# Altium footprint library ACTION_IC.PcbLib: 137 footprints (part 1 of 9)
Each footprint in its own frame and in the unit in brackets; x right, y up, seen from the top. Pads: shape width x height; smd on the part's side, far side on the other; paste and mask are expansions set on the pad; w line width, h text height; cw(c..) or ccw(c..) is an arc to the next point about the centre after c.
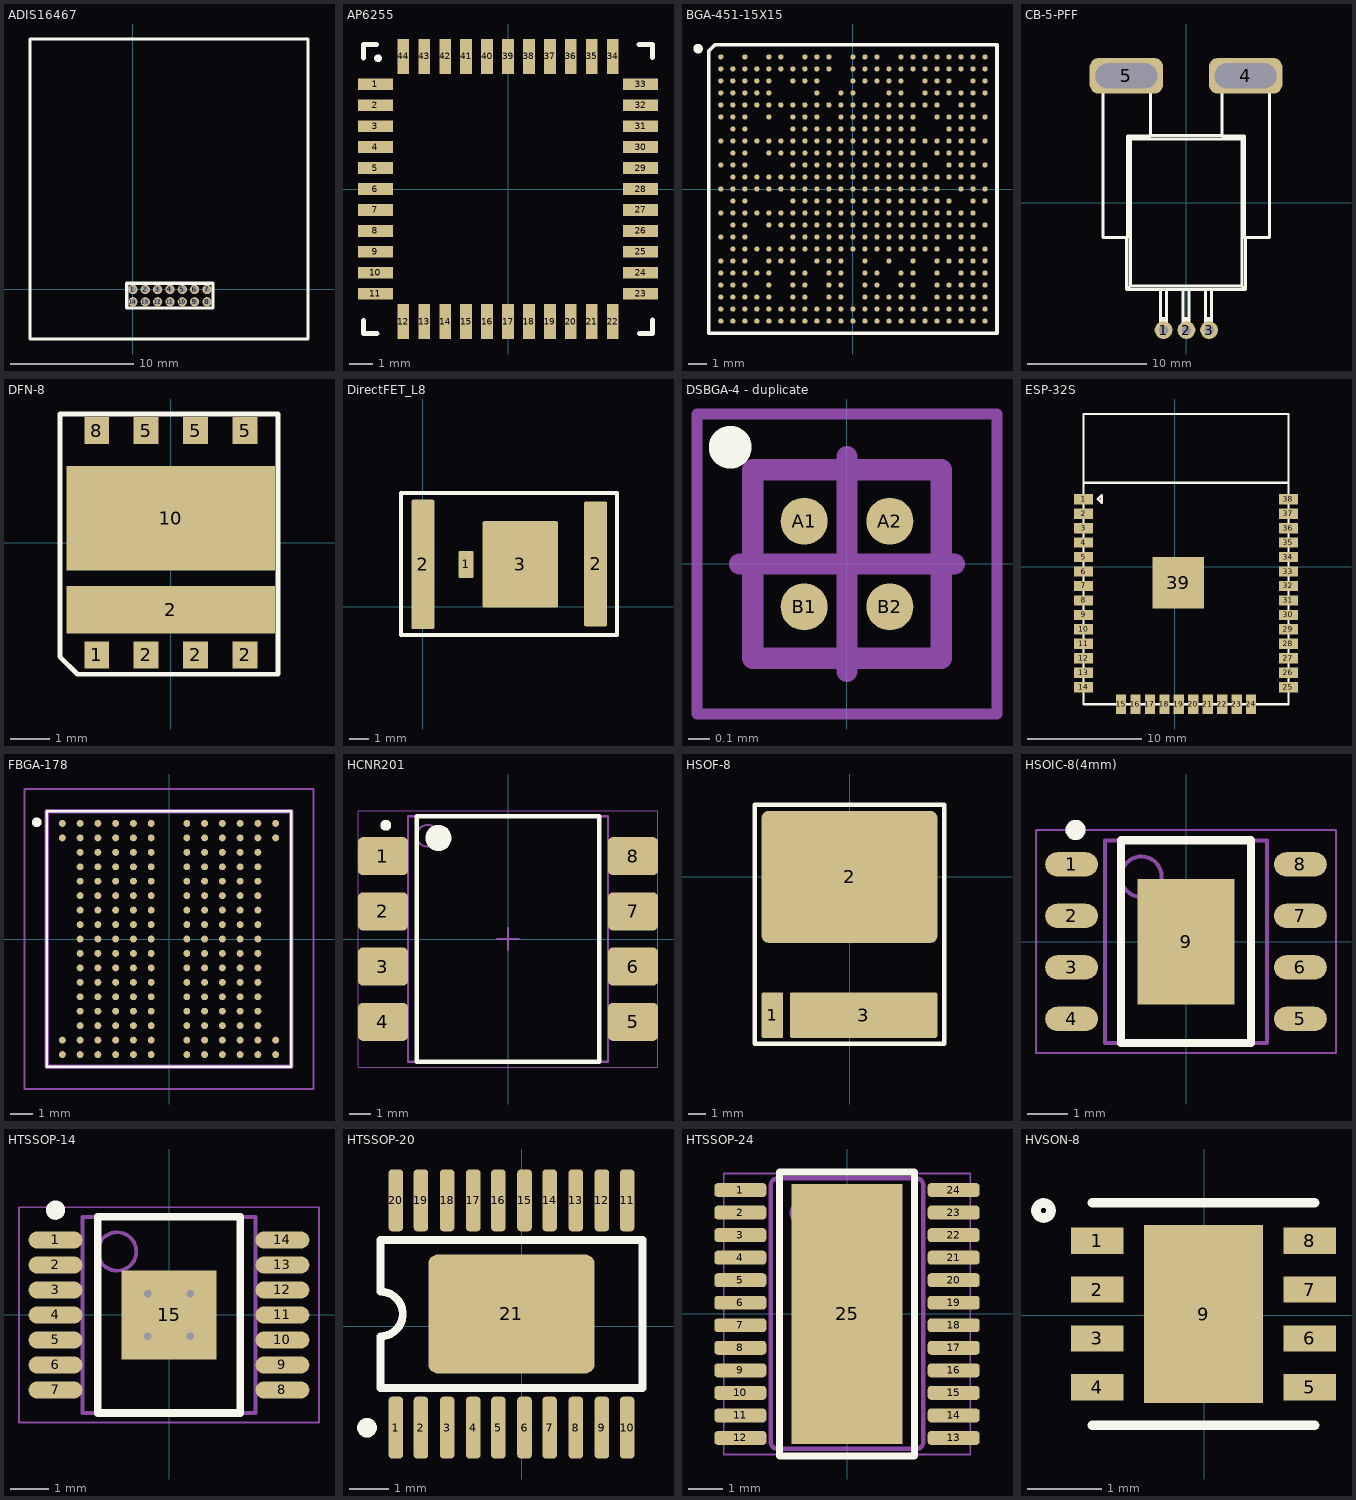
[diagram p0: the footprints below, top view; thin cyan lines are the x and y axes]

## ADIS16467 [mm]
pads (14):
  round 0.75 hole 0.5: 1(0,0) 2(1,0) 3(2,0) 4(3,0) 5(4,0) 6(5,0) 7(6,0) 8(6,-1) 9(5,-1) 10(4,-1) 11(3,-1) 12(2,-1) 13(1,-1) 14(0,-1)
Top Overlay:
  lines w0.254: -8.331,-4.013 14.173,-4.013 14.173,20.295 -8.331,20.295 -8.331,-4.013 ; -0.5,-1.5 6.5,-1.5 6.5,0.5 -0.5,0.5 -0.5,-1.5
3D body "ADIS16467-3BMLZ.STEP": height 9.11, standoff 0.11, extent -8.325,-4.013 14.167,20.287

## AP6255 [mm]
pads (44):
  rect 1.5x0.5 smd: 1(-5.688,4.5) 2(-5.688,3.6) 3(-5.688,2.7) 4(-5.688,1.8) 5(-5.688,0.9) 6(-5.688,0) 7(-5.688,-0.9) 8(-5.688,-1.8) 9(-5.688,-2.7) 10(-5.688,-3.6) 11(-5.688,-4.5) 23(5.688,-4.5) 24(5.688,-3.6) 25(5.688,-2.7) 26(5.688,-1.8) 27(5.688,-0.9) 28(5.688,0) 29(5.688,0.9) 30(5.688,1.8) 31(5.688,2.7) 32(5.688,3.6) 33(5.688,4.5)
  rect 0.5x1.5 smd: 12(-4.5,-5.688) 13(-3.6,-5.688) 14(-2.7,-5.688) 15(-1.8,-5.688) 16(-0.9,-5.688) 17(0,-5.688) 18(0.9,-5.688) 19(1.8,-5.688) 20(2.7,-5.688) 21(3.6,-5.688) 22(4.5,-5.688) 34(4.5,5.688) 35(3.6,5.688) 36(2.7,5.688) 37(1.8,5.688) 38(0.9,5.688) 39(0,5.688) 40(-0.9,5.688) 41(-1.8,5.688) 42(-2.7,5.688) 43(-3.6,5.688) 44(-4.5,5.688)
Top Overlay:
  circle w0.3: c-5.576,5.611 r0.018
  lines w0.2: -6.2,-6.2 -6.2,-5.632 ; -6.2,5.611 -6.2,5.756 -6.2,6.044 -6.2,6.189 ; -6.2,6.2 -5.632,6.2 ; -6.189,-6.2 -6.044,-6.2 -5.756,-6.2 -5.611,-6.2 ; 5.611,6.2 5.756,6.2 6.044,6.2 6.189,6.2 ; 5.632,-6.2 6.2,-6.2 ; 6.2,-6.189 6.2,-6.044 6.2,-5.756 6.2,-5.611 ; 6.2,5.632 6.2,6.2
3D body "User Library-AP62XX-1.step": height 1.52, standoff 0, extent -6,-6 6,6

## BGA-451-15X15 [mm]
pads (451):
  round 0.285 smd: A1(-7.15,7.15) A3(-5.85,7.15) A5(-4.55,7.15) A6(-3.9,7.15) A8(-2.6,7.15) A9(-1.95,7.15) A10(-1.3,7.15) A12(0,7.15) A13(0.65,7.15) A14(1.3,7.15) A16(2.6,7.15) A17(3.25,7.15) A18(3.9,7.15) A19(4.55,7.15) A20(5.2,7.15) A21(5.85,7.15) A22(6.5,7.15) A23(7.15,7.15) AA1(-7.15,-5.85) AA2(-6.5,-5.85) AA3(-5.85,-5.85) AA4(-5.2,-5.85) AA5(-4.55,-5.85) AA7(-3.25,-5.85) AA8(-2.6,-5.85) AA10(-1.3,-5.85) AA11(-0.65,-5.85) AA13(0.65,-5.85) AA14(1.3,-5.85) AA15(1.95,-5.85) AA16(2.6,-5.85) AA17(3.25,-5.85) AA19(4.55,-5.85) AA20(5.2,-5.85) AA21(5.85,-5.85) AA22(6.5,-5.85) AA23(7.15,-5.85) AB1(-7.15,-6.5) AB2(-6.5,-6.5) AB3(-5.85,-6.5) AB4(-5.2,-6.5) AB5(-4.55,-6.5) AB6(-3.9,-6.5) AB7(-3.25,-6.5) AB8(-2.6,-6.5) AB9(-1.95,-6.5) AB10(-1.3,-6.5) AB11(-0.65,-6.5) AB12(0,-6.5) AB13(0.65,-6.5) AB14(1.3,-6.5) AB15(1.95,-6.5) AB16(2.6,-6.5) AB17(3.25,-6.5) AB18(3.9,-6.5) AB19(4.55,-6.5) AB20(5.2,-6.5) AB21(5.85,-6.5) AB22(6.5,-6.5) AB23(7.15,-6.5) AC1(-7.15,-7.15) AC2(-6.5,-7.15) AC3(-5.85,-7.15) AC4(-5.2,-7.15) AC5(-4.55,-7.15) AC6(-3.9,-7.15) AC7(-3.25,-7.15) AC8(-2.6,-7.15) AC9(-1.95,-7.15) AC10(-1.3,-7.15) AC11(-0.65,-7.15) AC12(0,-7.15) AC13(0.65,-7.15) AC14(1.3,-7.15) AC15(1.95,-7.15) AC16(2.6,-7.15) AC17(3.25,-7.15) AC18(3.9,-7.15) AC19(4.55,-7.15) AC20(5.2,-7.15) AC21(5.85,-7.15) AC22(6.5,-7.15) AC23(7.15,-7.15) B1(-7.15,6.5) B2(-6.5,6.5) B3(-5.85,6.5) B4(-5.2,6.5) B5(-4.55,6.5) B6(-3.9,6.5) B7(-3.25,6.5) B8(-2.6,6.5) B9(-1.95,6.5) B10(-1.3,6.5) B12(0,6.5) B13(0.65,6.5) B14(1.3,6.5) B15(1.95,6.5) B16(2.6,6.5) B17(3.25,6.5) B18(3.9,6.5) B19(4.55,6.5) B20(5.2,6.5) B21(5.85,6.5) B22(6.5,6.5) B23(7.15,6.5) C1(-7.15,5.85) C2(-6.5,5.85) C3(-5.85,5.85) C4(-5.2,5.85) C5(-4.55,5.85) C7(-3.25,5.85) C8(-2.6,5.85) C9(-1.95,5.85) C12(0,5.85) C13(0.65,5.85) C14(1.3,5.85) C15(1.95,5.85) C16(2.6,5.85) C18(3.9,5.85) C19(4.55,5.85) C20(5.2,5.85) C22(6.5,5.85) C23(7.15,5.85) D1(-7.15,5.2) D2(-6.5,5.2) D3(-5.85,5.2) D4(-5.2,5.2) D5(-4.55,5.2) D9(-1.95,5.2) D11(-0.65,5.2) D12(0,5.2) D15(1.95,5.2) D16(2.6,5.2) D18(3.9,5.2) D19(4.55,5.2) D20(5.2,5.2) D21(5.85,5.2) D22(6.5,5.2) D23(7.15,5.2) E1(-7.15,4.55) E2(-6.5,4.55) E3(-5.85,4.55) E4(-5.2,4.55) E5(-4.55,4.55) E6(-3.9,4.55) E7(-3.25,4.55) E8(-2.6,4.55) E9(-1.95,4.55) E10(-1.3,4.55) E11(-0.65,4.55) E12(0,4.55) E13(0.65,4.55) E14(1.3,4.55) E15(1.95,4.55) E16(2.6,4.55) E17(3.25,4.55) E18(3.9,4.55) E19(4.55,4.55) E21(5.85,4.55) E22(6.5,4.55) F1(-7.15,3.9) F2(-6.5,3.9) F3(-5.85,3.9) F5(-4.55,3.9) F7(-3.25,3.9) F8(-2.6,3.9) F9(-1.95,3.9) F11(-0.65,3.9) F12(0,3.9) F13(0.65,3.9) F14(1.3,3.9) F15(1.95,3.9) F16(2.6,3.9) F17(3.25,3.9) F19(4.55,3.9) F20(5.2,3.9) F21(5.85,3.9) F22(6.5,3.9) F23(7.15,3.9) G2(-6.5,3.25) G3(-5.85,3.25) G7(-3.25,3.25) G8(-2.6,3.25) G9(-1.95,3.25) G10(-1.3,3.25) G11(-0.65,3.25) G12(0,3.25) G13(0.65,3.25) G14(1.3,3.25) G15(1.95,3.25) G16(2.6,3.25) G17(3.25,3.25) G20(5.2,3.25) G21(5.85,3.25) G22(6.5,3.25) H1(-7.15,2.6) H2(-6.5,2.6) H3(-5.85,2.6) H4(-5.2,2.6) H5(-4.55,2.6) H6(-3.9,2.6) H7(-3.25,2.6) H8(-2.6,2.6) H9(-1.95,2.6) H10(-1.3,2.6) H11(-0.65,2.6) H12(0,2.6) H13(0.65,2.6) H14(1.3,2.6) H15(1.95,2.6) H16(2.6,2.6) H17(3.25,2.6) H18(3.9,2.6) H19(4.55,2.6) H20(5.2,2.6) H21(5.85,2.6) H22(6.5,2.6) H23(7.15,2.6) J2(-6.5,1.95) J3(-5.85,1.95) J5(-4.55,1.95) J6(-3.9,1.95) J7(-3.25,1.95) J8(-2.6,1.95) J9(-1.95,1.95) J10(-1.3,1.95) J11(-0.65,1.95) J12(0,1.95) J13(0.65,1.95) J14(1.3,1.95) J15(1.95,1.95) J16(2.6,1.95) J17(3.25,1.95) J19(4.55,1.95) J20(5.2,1.95) J21(5.85,1.95) J22(6.5,1.95) K1(-7.15,1.3) K2(-6.5,1.3) K3(-5.85,1.3) K7(-3.25,1.3) K8(-2.6,1.3) K9(-1.95,1.3) K10(-1.3,1.3) K11(-0.65,1.3) K12(0,1.3) K13(0.65,1.3) K14(1.3,1.3) K15(1.95,1.3) K16(2.6,1.3) K17(3.25,1.3) K18(3.9,1.3) K20(5.2,1.3) K21(5.85,1.3) K22(6.5,1.3) K23(7.15,1.3) L2(-6.5,0.65) L3(-5.85,0.65) L4(-5.2,0.65) L5(-4.55,0.65) L6(-3.9,0.65) L7(-3.25,0.65) L8(-2.6,0.65) L9(-1.95,0.65) L10(-1.3,0.65) L11(-0.65,0.65) L12(0,0.65) L13(0.65,0.65) L14(1.3,0.65) L15(1.95,0.65) L16(2.6,0.65) L17(3.25,0.65) L18(3.9,0.65) L19(4.55,0.65) L20(5.2,0.65) L21(5.85,0.65) L22(6.5,0.65) M1(-7.15,0) M2(-6.5,0) M3(-5.85,0) M4(-5.2,0) M5(-4.55,0) M6(-3.9,0) M7(-3.25,0) M8(-2.6,0) M9(-1.95,0) M10(-1.3,0) M11(-0.65,0) M12(0,0) M13(0.65,0) M14(1.3,0) M15(1.95,0) M16(2.6,0) M17(3.25,0) M18(3.9,0) M19(4.55,0) M21(5.85,0) M22(6.5,0) M23(7.15,0) N2(-6.5,-0.65) N3(-5.85,-0.65) N7(-3.25,-0.65) N8(-2.6,-0.65) N9(-1.95,-0.65) N10(-1.3,-0.65) N11(-0.65,-0.65) N12(0,-0.65) N13(0.65,-0.65) N14(1.3,-0.65) N15(1.95,-0.65) N16(2.6,-0.65) N17(3.25,-0.65) N18(3.9,-0.65) N19(4.55,-0.65) N20(5.2,-0.65) N22(6.5,-0.65) N23(7.15,-0.65) P1(-7.15,-1.3) P2(-6.5,-1.3) P3(-5.85,-1.3) P4(-5.2,-1.3) P5(-4.55,-1.3) P6(-3.9,-1.3) P7(-3.25,-1.3) P8(-2.6,-1.3) P9(-1.95,-1.3) P10(-1.3,-1.3) P11(-0.65,-1.3) P12(0,-1.3) P13(0.65,-1.3) P14(1.3,-1.3) P15(1.95,-1.3) P16(2.6,-1.3) P17(3.25,-1.3) P18(3.9,-1.3) P19(4.55,-1.3) P20(5.2,-1.3) P21(5.85,-1.3) P22(6.5,-1.3) R2(-6.5,-1.95) R3(-5.85,-1.95) R5(-4.55,-1.95) R6(-3.9,-1.95) R7(-3.25,-1.95) R8(-2.6,-1.95) R9(-1.95,-1.95) R10(-1.3,-1.95) R11(-0.65,-1.95) R12(0,-1.95) R13(0.65,-1.95) R14(1.3,-1.95) R15(1.95,-1.95) R16(2.6,-1.95) R17(3.25,-1.95) R18(3.9,-1.95) R19(4.55,-1.95) R20(5.2,-1.95) R21(5.85,-1.95) R22(6.5,-1.95) R23(7.15,-1.95) T1(-7.15,-2.6) T2(-6.5,-2.6) T3(-5.85,-2.6) T7(-3.25,-2.6) T8(-2.6,-2.6) T9(-1.95,-2.6) T10(-1.3,-2.6) T11(-0.65,-2.6) T12(0,-2.6) T13(0.65,-2.6) T14(1.3,-2.6) T15(1.95,-2.6) T16(2.6,-2.6) T17(3.25,-2.6) T18(3.9,-2.6) T19(4.55,-2.6) T20(5.2,-2.6) T21(5.85,-2.6) T22(6.5,-2.6) U2(-6.5,-3.25) U3(-5.85,-3.25) U4(-5.2,-3.25) U5(-4.55,-3.25) U6(-3.9,-3.25) U7(-3.25,-3.25) U8(-2.6,-3.25) U9(-1.95,-3.25) U10(-1.3,-3.25) U11(-0.65,-3.25) U12(0,-3.25) U13(0.65,-3.25) U14(1.3,-3.25) U15(1.95,-3.25) U16(2.6,-3.25) U17(3.25,-3.25) U18(3.9,-3.25) U19(4.55,-3.25) U21(5.85,-3.25) U22(6.5,-3.25) U23(7.15,-3.25) V1(-7.15,-3.9) V2(-6.5,-3.9) V3(-5.85,-3.9) V5(-4.55,-3.9) V6(-3.9,-3.9) V7(-3.25,-3.9) V9(-1.95,-3.9) V10(-1.3,-3.9) V11(-0.65,-3.9) V13(0.65,-3.9) V15(1.95,-3.9) V17(3.25,-3.9) V19(4.55,-3.9) V20(5.2,-3.9) V21(5.85,-3.9) V22(6.5,-3.9) V23(7.15,-3.9) W1(-7.15,-4.55) W2(-6.5,-4.55) W3(-5.85,-4.55) W4(-5.2,-4.55) W5(-4.55,-4.55) W7(-3.25,-4.55) W8(-2.6,-4.55) W10(-1.3,-4.55) W11(-0.65,-4.55) W13(0.65,-4.55) W14(1.3,-4.55) W16(2.6,-4.55) W17(3.25,-4.55) W19(4.55,-4.55) W21(5.85,-4.55) W22(6.5,-4.55) W23(7.15,-4.55) Y1(-7.15,-5.2) Y2(-6.5,-5.2) Y3(-5.85,-5.2) Y5(-4.55,-5.2) Y7(-3.25,-5.2) Y8(-2.6,-5.2) Y10(-1.3,-5.2) Y11(-0.65,-5.2) Y13(0.65,-5.2) Y14(1.3,-5.2) Y16(2.6,-5.2) Y17(3.25,-5.2) Y19(4.55,-5.2) Y20(5.2,-5.2) Y21(5.85,-5.2) Y22(6.5,-5.2) Y23(7.15,-5.2)
Top Overlay:
  circle w0.4: c-8.382,7.595 r0.057
  lines w0.2: -7.8,-7.8 7.8,-7.8 7.8,7.8 -7.475,7.8 -7.8,7.475 -7.8,-7.8
3D body "User Library-LFBGA364.STEP": height 1.5, standoff 0, extent -7.5,-7.5 7.5,7.5

## CB-5-PFF [mm]
pads (5):
  round 1.5 hole 0.8: 1(-1.892,-10.706) 2(0.038,-10.706) 3(1.943,-10.706)
  rrect50% 6.2x3 hole 2.1 slot 5.2 at 0 deg: 4(5.016,10.706) 5(-5.016,10.706)
Top Overlay:
  lines w0.254: -4.989,-2.901 -4.989,-7.301 ; -2.989,5.699 3.011,5.699 ; -2.139,-10.552 -2.139,-9.982 ; -2.139,-10.431 -2.139,-9.743 ; -1.639,-10.552 -1.639,-9.982 ; -1.639,-10.431 -1.639,-9.743 ; -0.239,-10.552 -0.239,-9.982 ; -0.239,-10.431 -0.239,-9.743 ; 0.261,-10.552 0.261,-9.982 ; 0.261,-10.431 0.261,-9.743 ; 1.661,-10.552 1.661,-9.982 ; 1.661,-10.431 1.661,-9.743 ; 2.161,-10.552 2.161,-9.982 ; 2.161,-10.431 2.161,-9.743 ; 5.011,-2.901 5.011,-7.301 ; -6.989,9.475 -6.989,11.724 ; -6.989,9.475 -6.989,-2.901 -4.923,-2.901 -4.923,5.633 ; -6.989,9.475 -2.989,9.475 ; -6.989,11.724 -6.989,11.821 -2.989,11.821 -2.989,11.724 ; -6.989,11.724 -2.989,11.724 ; -4.989,-7.301 -4.682,-6.995 ; -4.989,-7.301 -2.139,-7.301 ; -4.923,5.633 -4.682,5.392 ; -4.923,5.633 -2.989,5.633 -2.989,9.475 ; -4.682,-6.995 -4.682,5.392 ; -4.682,-6.995 4.705,-6.995 ; -4.682,5.392 4.705,5.392 ; -2.989,9.475 -2.989,11.724 ; -2.139,-9.982 -1.639,-9.982 ; -2.139,-9.982 -1.639,-9.982 ; -2.139,-9.743 -2.139,-7.301 ; -2.139,-9.743 -1.639,-9.743 ; -2.139,-7.301 -1.639,-7.301 ; -1.639,-9.743 -1.639,-7.301 ; -1.639,-7.301 -0.239,-7.301 ; -0.239,-9.982 0.261,-9.982 ; -0.239,-9.982 0.261,-9.982 ; -0.239,-9.743 -0.239,-7.301 ; -0.239,-9.743 0.261,-9.743 ; -0.239,-7.301 0.261,-7.301 ; 0.261,-9.743 0.261,-7.301 ; 0.261,-7.301 1.661,-7.301 ; 1.661,-9.982 2.161,-9.982 ; 1.661,-9.982 2.161,-9.982 ; 1.661,-9.743 1.661,-7.301 ; 1.661,-9.743 2.161,-9.743 ; 1.661,-7.301 2.161,-7.301 ; 2.161,-9.743 2.161,-7.301 ; 2.161,-7.301 5.011,-7.301 ; 3.011,9.475 3.011,11.724 ; 3.011,9.475 3.011,5.633 4.946,5.633 ; 3.011,9.475 7.011,9.475 ; 3.011,11.724 3.011,11.821 7.011,11.821 7.011,11.724 ; 3.011,11.724 7.011,11.724 ; 4.705,-6.995 5.011,-7.301 ; 4.705,-6.995 4.705,5.392 ; 4.705,5.392 4.946,5.633 ; 4.946,5.633 4.946,-2.901 7.011,-2.901 7.011,9.475 ; 7.011,9.475 7.011,11.724
3D body "SW3dPS-ACS754SCB-200-PFF.STEP": height 7.31, standoff -3.2, extent -6.951,-11.24 7.049,11.582

## DFN-8 [mm]
height 1.1
pads (10):
  rect 0.64x0.69 smd mask+0.102: 1(-1.905,-2.88) 2(-0.635,-2.88) 2(0.635,-2.88) 2(1.905,-2.88) 5(-0.635,2.88) 5(0.635,2.88) 5(1.905,2.88) 8(-1.905,2.88)
  rect 5.35x1.22 smd: 2(0,-1.72)
  rect 5.35x2.68 smd: 10(0,0.63)
Top Overlay:
  lines w0.127: -2.85,-2.925 -2.4,-3.375 2.75,-3.375 2.75,3.3 -2.85,3.3 -2.85,-2.925
3D body: height 0.25, standoff 0, extent -2.547,-3.125 2.547,3.125

## DirectFET_L8 [mm]
pads (4):
  rrect15% 0.8x1.4 smd: 1(2.25,2.2)
  rrect15% 1.2x6.75 smd: 2(0,2.2)
  rrect15% 1.2x6.5 smd: 2(9,2.225)
  rrect5% 3.95x4.5 smd: 3(5.075,2.2)
Top Overlay:
  lines w0.2: -1.143,-1.473 10.109,-1.473 10.109,5.918 -0.66,5.918 -1.143,5.918 -1.143,-1.473
3D body "User Library-DirectFET-L8_AUIRF7669L2.step": height 0.83, standoff 0, extent -0.105,-1.315 9.045,5.785

## DSBGA-4 - duplicate [mm] "BGA, 4-Leads, Body 0.88x0.88mmx0.68mm, Pitch 0.40mm"
height 0.68
pads (4):
  round 0.22 smd: A1(-0.2,0.2) A2(0.2,0.2) B1(-0.2,-0.2) B2(0.2,-0.2)
Top Overlay:
  circle w0.1: c-0.545,0.545 r0.05
Mechanical 13:
  lines w0.1: -0.44,-0.44 0.44,-0.44 0.44,0.44 -0.44,0.44 -0.44,-0.44
Mechanical 15:
  lines w0.05: -0.7,-0.7 0.7,-0.7 0.7,0.7 -0.7,0.7 -0.7,-0.7
  lines w0.1: -0.5,0 0.5,0 ; 0,-0.5 0,0.5
3D body: height 0.68, standoff 0.17, extent -0.44,-0.44 0.44,0.44

## ESP-32S [mm]
pads (39):
  rect 1.7x0.9 smd: 1(-8.009,5.937) 2(-8.009,4.667) 3(-8.009,3.397) 4(-8.009,2.127) 5(-8.009,0.857) 6(-8.009,-0.413) 7(-8.009,-1.683) 8(-8.009,-2.953) 9(-8.009,-4.223) 10(-8.009,-5.493) 11(-8.009,-6.763) 12(-8.009,-8.033) 13(-8.009,-9.303) 14(-8.009,-10.573) 25(9.991,-10.573) 26(9.991,-9.303) 27(9.991,-8.033) 28(9.991,-6.763) 29(9.991,-5.493) 30(9.991,-4.223) 31(9.991,-2.953) 32(9.991,-1.683) 33(9.991,-0.413) 34(9.991,0.857) 35(9.991,2.127) 36(9.991,3.397) 37(9.991,4.667) 38(9.991,5.937)
  rect 0.9x1.7 smd: 15(-4.719,-12.083) 16(-3.449,-12.083) 17(-2.179,-12.083) 18(-0.909,-12.083) 19(0.361,-12.083) 20(1.631,-12.083) 21(2.901,-12.083) 22(4.171,-12.083) 23(5.441,-12.083) 24(6.711,-12.083)
  rect 4.5x4.5 smd: 39(0.311,-1.403)
Top Overlay:
  lines w0.2: -8.009,7.377 9.991,7.377 ; -8.009,-12.073 9.991,-12.073 9.991,13.427 -8.009,13.427 -8.009,-12.073 ; -6.759,5.957 -6.409,6.307 -6.409,5.607 -6.759,5.957

## FBGA-178 [mm]
pads (178):
  round 0.31 smd: A1(-4.8,5.2) A2(-4,5.2) A3(-3.2,5.2) A4(-2.4,5.2) A5(-1.6,5.2) A6(-0.8,5.2) A8(0.8,5.2) A9(1.6,5.2) A10(2.4,5.2) A11(3.2,5.2) A12(4,5.2) A13(4.8,5.2) B1(-4.8,4.55) B2(-4,4.55) B3(-3.2,4.55) B4(-2.4,4.55) B5(-1.6,4.55) B6(-0.8,4.55) B8(0.8,4.55) B9(1.6,4.55) B10(2.4,4.55) B11(3.2,4.55) B12(4,4.55) B13(4.8,4.55) C2(-4,3.9) C3(-3.2,3.9) C4(-2.4,3.9) C5(-1.6,3.9) C6(-0.8,3.9) C8(0.8,3.9) C9(1.6,3.9) C10(2.4,3.9) C11(3.2,3.9) C12(4,3.9) D2(-4,3.25) D3(-3.2,3.25) D4(-2.4,3.25) D5(-1.6,3.25) D6(-0.8,3.25) D8(0.8,3.25) D9(1.6,3.25) D10(2.4,3.25) D11(3.2,3.25) D12(4,3.25) E2(-4,2.6) E3(-3.2,2.6) E4(-2.4,2.6) E5(-1.6,2.6) E6(-0.8,2.6) E8(0.8,2.6) E9(1.6,2.6) E10(2.4,2.6) E11(3.2,2.6) E12(4,2.6) F2(-4,1.95) F3(-3.2,1.95) F4(-2.4,1.95) F5(-1.6,1.95) F6(-0.8,1.95) F8(0.8,1.95) F9(1.6,1.95) F10(2.4,1.95) F11(3.2,1.95) F12(4,1.95) G2(-4,1.3) G3(-3.2,1.3) G4(-2.4,1.3) G5(-1.6,1.3) G6(-0.8,1.3) G8(0.8,1.3) G9(1.6,1.3) G10(2.4,1.3) G11(3.2,1.3) G12(4,1.3) H2(-4,0.65) H3(-3.2,0.65) H4(-2.4,0.65) H5(-1.6,0.65) H6(-0.8,0.65) H8(0.8,0.65) H9(1.6,0.65) H10(2.4,0.65) H11(3.2,0.65) H12(4,0.65) J2(-4,0) J3(-3.2,0) J4(-2.4,0) J5(-1.6,0) J6(-0.8,0) J8(0.8,0) J9(1.6,0) J10(2.4,0) J11(3.2,0) J12(4,0) K2(-4,-0.65) K3(-3.2,-0.65) K4(-2.4,-0.65) K5(-1.6,-0.65) K6(-0.8,-0.65) K8(0.8,-0.65) K9(1.6,-0.65) K10(2.4,-0.65) K11(3.2,-0.65) K12(4,-0.65) L2(-4,-1.3) L3(-3.2,-1.3) L4(-2.4,-1.3) L5(-1.6,-1.3) L6(-0.8,-1.3) L8(0.8,-1.3) L9(1.6,-1.3) L10(2.4,-1.3) L11(3.2,-1.3) L12(4,-1.3) M2(-4,-1.95) M3(-3.2,-1.95) M4(-2.4,-1.95) M5(-1.6,-1.95) M6(-0.8,-1.95) M8(0.8,-1.95) M9(1.6,-1.95) M10(2.4,-1.95) M11(3.2,-1.95) M12(4,-1.95) N2(-4,-2.6) N3(-3.2,-2.6) N4(-2.4,-2.6) N5(-1.6,-2.6) N6(-0.8,-2.6) N8(0.8,-2.6) N9(1.6,-2.6) N10(2.4,-2.6) N11(3.2,-2.6) N12(4,-2.6) P2(-4,-3.25) P3(-3.2,-3.25) P4(-2.4,-3.25) P5(-1.6,-3.25) P6(-0.8,-3.25) P8(0.8,-3.25) P9(1.6,-3.25) P10(2.4,-3.25) P11(3.2,-3.25) P12(4,-3.25) R2(-4,-3.9) R3(-3.2,-3.9) R4(-2.4,-3.9) R5(-1.6,-3.9) R6(-0.8,-3.9) R8(0.8,-3.9) R9(1.6,-3.9) R10(2.4,-3.9) R11(3.2,-3.9) R12(4,-3.9) T1(-4.8,-4.55) T2(-4,-4.55) T3(-3.2,-4.55) T4(-2.4,-4.55) T5(-1.6,-4.55) T6(-0.8,-4.55) T8(0.8,-4.55) T9(1.6,-4.55) T10(2.4,-4.55) T11(3.2,-4.55) T12(4,-4.55) T13(4.8,-4.55) U1(-4.8,-5.2) U2(-4,-5.2) U3(-3.2,-5.2) U4(-2.4,-5.2) U5(-1.6,-5.2) U6(-0.8,-5.2) U8(0.8,-5.2) U9(1.6,-5.2) U10(2.4,-5.2) U11(3.2,-5.2) U12(4,-5.2) U13(4.8,-5.2)
Top Overlay:
  circle w0.254: c-5.95,5.25 r0.09
  lines w0.1: -5.5,-5.75 -5.5,5.75 5.5,5.75 5.5,-5.75 -5.5,-5.75
Mechanical 13:
  lines w0.2: -5.5,-5.75 -5.5,5.75 5.5,5.75 5.5,-5.75 -5.5,-5.75
Mechanical 15:
  lines w0.1: -6.5,-6.75 -6.5,6.75 6.5,6.75 6.5,-6.75 -6.5,-6.75
3D body "W63CH2MBVACE.stp": height 1.1, standoff 0, extent -5.5,-5.75 5.5,5.75

## HCNR201 [mm]
height 4
pads (8):
  rrect25% 2.3x1.75 smd: 1(-5.752,3.81) 2(-5.752,1.27) 3(-5.752,-1.27) 4(-5.752,-3.81) 5(5.752,-3.81) 6(5.752,-1.27) 7(5.752,1.27) 8(5.752,3.81)
Top Overlay:
  circle w0.6: c-3.2,4.65 r0.3
  circle w0.25: c-5.625,5.235 r0.125
  lines w0.2: -4.2,-5.65 4.2,-5.65 4.2,5.65 -4.2,5.65 -4.2,-5.65
Mechanical 13:
  circle w0.1: c-3.7,4.75 r0.5
  lines w0.1: -4.6,-5.65 4.6,-5.65 4.6,5.65 -4.6,5.65 -4.6,-5.65
Mechanical 15:
  lines w0.05: -6.9,-5.9 6.9,-5.9 6.9,5.9 -6.9,5.9 -6.9,-5.9
  lines w0.1: -0.5,0 0.5,0 ; 0,-0.5 0,0.5
3D body "SOP-8(9mm).step": height 4, standoff 0, extent -6.15,-5.65 6.15,5.65

## HSOF-8 [mm]
pads (3):
  rrect15% 1.225x2.6 smd: 1(-4.388,-7.868)
  rrect10% 10x7.5 smd: 2(0,0)
  rrect10% 8.4x2.6 smd: 3(0.8,-7.868)
Top Overlay:
  lines w0.254: -5.4,-9.5 5.4,-9.5 5.4,4.1 -5.4,4.1 -5.4,-9.5
3D body "User Library-PG-HSOF-8-1.STEP": height 2.35, standoff 0.05, extent -4.95,-8.578 4.95,3.097

## HSOIC-8(4mm) [mm]
height 1.7
pads (9):
  oval 1.3x0.6 smd: 1(-2.824,1.905) 2(-2.824,0.635) 3(-2.824,-0.635) 4(-2.824,-1.905) 5(2.824,-1.905) 6(2.824,-0.635) 7(2.824,0.635) 8(2.824,1.905)
  rect 2.4x3.1 smd: 9(0,0)
Top Overlay:
  circle w0.25: c-2.725,2.755 r0.125
  lines w0.2: -1.6,-2.5 -1.6,2.5 1.6,2.5 1.6,-2.5 -1.6,-2.5
Mechanical 13:
  circle w0.1: c-1.1,1.6 r0.5
  lines w0.1: -2,-2.5 -2,2.5 2,2.5 2,-2.5 -2,-2.5
Mechanical 15:
  lines w0.05: -3.7,-2.75 -3.7,2.75 3.7,2.75 3.7,-2.75 -3.7,-2.75
  lines w0.1: -0.5,0 0.5,0 ; 0,-0.5 0,0.5
3D body "User Library-sop-8.STEP": height 1.6, standoff 0, extent -3.021,-2.51 3.021,2.51

## HTSSOP-14 [mm]
height 1.2
pads (15):
  oval 1.4x0.45 smd: 1(-2.95,1.95) 2(-2.95,1.3) 3(-2.95,0.65) 4(-2.95,0) 5(-2.95,-0.65) 6(-2.95,-1.3) 7(-2.95,-1.95) 8(2.95,-1.95) 9(2.95,-1.3) 10(2.95,-0.65) 11(2.95,0) 12(2.95,0.65) 13(2.95,1.3) 14(2.95,1.95)
  rect 2.46x2.31 smd: 15(0,0)
via 0.55,-0.55 diameter 0.5 hole 0.2
via -0.55,-0.55 diameter 0.5 hole 0.2
via 0.55,0.55 diameter 0.5 hole 0.2
via -0.55,0.55 diameter 0.5 hole 0.2
Top Overlay:
  circle w0.25: c-2.95,2.725 r0.125
  lines w0.2: -1.85,-2.55 1.85,-2.55 1.85,2.55 -1.85,2.55 -1.85,-2.55
Mechanical 13:
  circle w0.1: c-1.35,1.65 r0.5
  lines w0.1: -2.25,-2.55 2.25,-2.55 2.25,2.55 -2.25,2.55 -2.25,-2.55
Mechanical 15:
  lines w0.05: -3.9,-2.8 3.9,-2.8 3.9,2.8 -3.9,2.8 -3.9,-2.8
  lines w0.1: -0.5,0 0.5,0 ; 0,-0.5 0,0.5
3D body "HTSSOP-14.step": height 1.2, standoff 0, extent -3.2,-2.55 3.2,2.55

## HTSSOP-20 [mil]
pads (21):
  rrect50% 14.5x61.5 smd: 1(-125,-100.99) 2(-100,-100.99) 3(-74,-100.99) 4(-48,-100.99) 5(-23,-100.99) 6(3,-100.99) 7(28,-100.99) 8(54,-100.99) 9(80,-100.99) 10(105,-100.99) 11(105,125.01) 12(80,125.01) 13(54,125.01) 14(28,125.01) 15(3,125.01) 16(-23,125.01) 17(-48,125.01) 18(-74,125.01) 19(-100,125.01) 20(-125,125.01)
  rrect15% 165.35x118.11 smd: 21(-10,12.01)
Top Overlay:
  lines w7.9: -140.31,-61.46 -140.31,-10.28 ccw(c-140.31,12.01) -140.32,34.31 -140.31,85.49 120.31,85.49 120.31,-61.46 -140.31,-61.46
  lines w9.8: -153.7,-96.29 ccw(c-153.65,-101.19) -153.6,-96.29
3D body "User Library-HTSSOP20.step": height 37.4, standoff -2.26, extent -137.95,-113.54 117.95,139

## HTSSOP-24 [mm]
pads (25):
  rrect50% 1.5x0.4 smd paste+0 mask+0.051: 1(-3.076,3.575) 2(-3.076,2.925) 3(-3.076,2.275) 4(-3.076,1.625) 5(-3.076,0.975) 6(-3.076,0.325) 7(-3.076,-0.325) 8(-3.076,-0.975) 9(-3.076,-1.625) 10(-3.076,-2.275) 11(-3.076,-2.925) 12(-3.076,-3.575) 13(3.076,-3.575) 14(3.076,-2.925) 15(3.076,-2.275) 16(3.076,-1.625) 17(3.076,-0.975) 18(3.076,-0.325) 19(3.076,0.325) 20(3.076,0.975) 21(3.076,1.625) 22(3.076,2.275) 23(3.076,2.925) 24(3.076,3.575)
  rect 3.2x7.5 smd paste-3.887 mask-3.886: 25(0,0)
Top Overlay:
  lines w0.2: -1.95,-4.1 1.95,-4.1 1.95,4.1 -1.95,4.1 -1.95,-4.1
Top Paste:
  region: 1.587,-2.629 1.577,-2.63 -1.527,-2.63 -1.536,-2.629 -1.545,-2.626 -1.553,-2.622 -1.561,-2.616 -1.567,-2.609 -1.571,-2.6 -1.574,-2.591 -1.575,-2.582 -1.575,2.582 -1.574,2.591 -1.571,2.6 -1.567,2.609 -1.561,2.616 -1.553,2.622 -1.545,2.626 -1.536,2.629 -1.527,2.63 1.577,2.63 1.587,2.629 1.596,2.626 1.604,2.622 1.611,2.616 1.617,2.609 1.622,2.6 1.624,2.591 1.625,2.582 1.625,-2.582 1.624,-2.591 1.622,-2.6 1.617,-2.609 1.611,-2.616 1.604,-2.622 1.596,-2.626
Top Solder:
  region: 1.587,-2.629 1.577,-2.63 -1.527,-2.63 -1.536,-2.629 -1.545,-2.626 -1.553,-2.622 -1.561,-2.616 -1.567,-2.609 -1.571,-2.6 -1.574,-2.591 -1.575,-2.582 -1.575,2.582 -1.574,2.591 -1.571,2.6 -1.567,2.609 -1.561,2.616 -1.553,2.622 -1.545,2.626 -1.536,2.629 -1.527,2.63 1.577,2.63 1.587,2.629 1.596,2.626 1.604,2.622 1.611,2.616 1.617,2.609 1.622,2.6 1.624,2.591 1.625,2.582 1.625,-2.582 1.624,-2.591 1.622,-2.6 1.617,-2.609 1.611,-2.616 1.604,-2.622 1.596,-2.626
Mechanical 13:
  lines w0.127: -2.2,-3.689 ccw(c-2,-3.689) -2,-3.889 2,-3.889 ccw(c2,-3.689) 2.2,-3.689 2.2,3.711 ccw(c2,3.711) 2,3.911 -2,3.911 ccw(c-2,3.711) -2.2,3.711 -2.2,-3.689 ; -1.19,2.511 cw(c-1.19,2.911) -1.19,3.311 cw(c-1.19,2.911) -1.19,2.511
Mechanical 15:
  lines w0.05: -3.55,-4.05 -3.55,4.05 3.55,4.05 3.55,-4.05 -3.55,-4.05
  lines w0.1: -0.5,0 0.5,0 ; 0,-0.5 0,0.5
3D body "PWP0024M.stp": height 1.13, standoff 0, extent -3.2,-3.9 3.2,3.9

## HVSON-8 [mil]
pads (9):
  rect 28x14 smd: 1(-56.85,39.58) 2(-56.85,13.58) 3(-56.85,-12.42) 4(-56.85,-38.42) 5(55.95,-38.42) 6(55.95,-12.42) 7(55.95,13.58) 8(55.95,39.58)
  rect 62.99x94.49 smd: 9(-0.45,0.58)
Top Overlay:
  circle w5.08: c-85.45,55.58 r4
  lines w5.08: -59.51,-58.48 58.6,-58.48 ; -59.51,59.63 58.6,59.63
3D body "User Library-HVSON-8.STEP": height 39.37, standoff 0, extent -59.11,-57.66 59,59.66